# Altium footprint library TriggersLib.PcbLib: 262 footprints (part 12 of 17)
Each footprint in its own frame and in the unit in brackets; x right, y up, seen from the top. Pads: shape width x height; smd on the part's side, far side on the other; paste and mask are expansions set on the pad; w line width, h text height; cw(c..) or ccw(c..) is an arc to the next point about the centre after c.
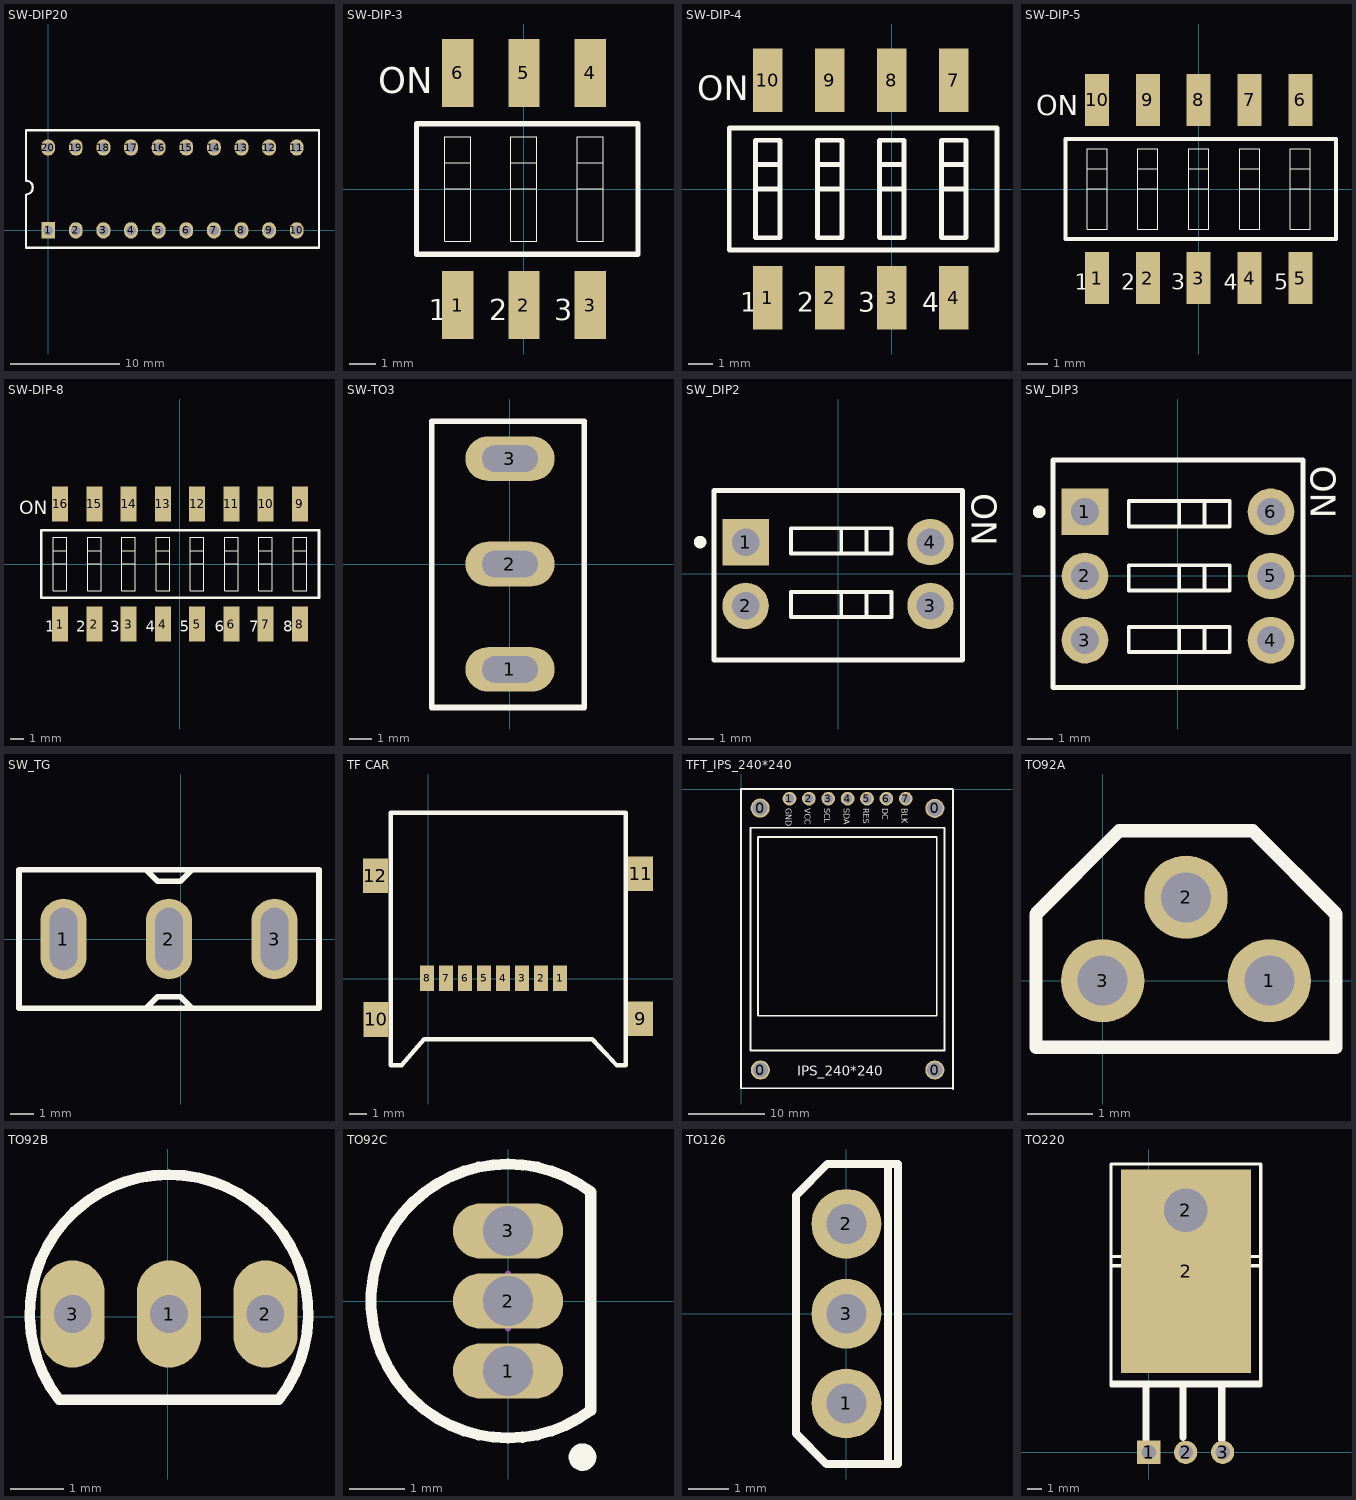
[diagram p11: the footprints below, top view; thin cyan lines are the x and y axes]

## SW-DIP20 [mm] "DIP; 16 Leads; Row Spacing 7.62 mm; Pitch 2.54 mm"
pads (20):
  rect 1.27x1.5 hole 0.9: 1(0,0)
  oval 1.27x1.5 hole 0.9: 2(2.54,0) 3(5.08,0) 4(7.62,0) 5(10.16,0) 6(12.7,0) 7(15.24,0) 8(17.78,0) 9(20.32,0) 10(22.86,0) 11(22.86,7.62) 12(20.32,7.62) 13(17.78,7.62) 14(15.24,7.62) 15(12.7,7.62) 16(10.16,7.62) 17(7.62,7.62) 18(5.08,7.62) 19(2.54,7.62) 20(0,7.62)
Top Overlay:
  lines w0.2: -2.05,-1.59 -2.05,3.3 ccw(c-2.05,3.935) -2.05,4.57 ; -2.05,4.6 -2.05,9.2 ; 24.91,-1.59 24.91,9.2
  lines w0.203: -2.05,-1.59 24.892,-1.59 ; -2.05,9.2 24.892,9.2
3D body "User Library-DIP Switch Piano 10X.STEP": height 8.71, standoff -3.99, extent -2.086,-2.639 24.794,8.661

## SW-DIP-3 [mm] "DIP Switch; 16 Leads"
height 5.06
pads (6):
  rect 1.2x2.6 smd: 1(-2.54,-4.45) 2(0,-4.45) 3(2.54,-4.45) 4(2.54,4.45) 5(0,4.45) 6(-2.54,4.45)
Top Overlay:
  lines w0.025: -3.04,0 -2.04,0 ; -3.04,1 -2.04,1 ; -0.5,0 0.5,0 ; -0.5,1 0.5,1 ; 2.04,0 3.04,0 ; 2.04,1 3.04,1 ; -3.04,-2 -3.04,2 -2.04,2 -2.04,-2 -3.04,-2 ; -0.5,-2 -0.5,2 0.5,2 0.5,-2 -0.5,-2 ; 2.04,-2 2.04,2 3.04,2 3.04,-2 2.04,-2
  lines w0.2: -4.115,-2.5 -4.115,2.5 4.369,2.5 4.369,-2.5 -4.115,-2.5
  text "3" at 1.169,-5.032 h0.8
  text "2" at -1.331,-5.032 h0.8
  text "1" at -3.656,-5.032 h0.8
  text "ON" at -5.588,3.678 h1
3D body "DIP3.stp": height 4.4, standoff 0, extent -4.293,-4.951 4.267,4.849

## SW-DIP-4 [mm] "DIP Switch; 16 Leads"
height 5.06
pads (8):
  rect 1.2x2.6 smd: 1(-5.08,-4.45) 2(-2.54,-4.45) 3(0,-4.45) 4(2.54,-4.45) 7(2.54,4.45) 8(0,4.45) 9(-2.54,4.45) 10(-5.08,4.45)
Top Overlay:
  lines w0.2: -5.58,0 -4.58,0 ; -5.58,1 -4.58,1 ; -3.04,0 -2.04,0 ; -3.04,1 -2.04,1 ; -0.5,0 0.5,0 ; -0.5,1 0.5,1 ; 2.04,0 3.04,0 ; 2.04,1 3.04,1 ; -6.655,-2.5 -6.655,2.5 4.318,2.5 4.318,-2.5 -6.655,-2.5 ; -5.58,-2 -5.58,2 -4.58,2 -4.58,-2 -5.58,-2 ; -3.04,-2 -3.04,2 -2.04,2 -2.04,-2 -3.04,-2 ; -0.5,-2 -0.5,2 0.5,2 0.5,-2 -0.5,-2 ; 2.04,-2 2.04,2 3.04,2 3.04,-2 2.04,-2
  text "4" at 1.254,-5.032 h0.8
  text "3" at -1.371,-5.032 h0.8
  text "2" at -3.871,-5.032 h0.8
  text "1" at -6.196,-5.032 h0.8
  text "ON" at -7.976,3.632 h1
3D body "User Library-SMD DIP-4 switch.step": height -0.5, standoff -5.4, extent -6.845,-4.976 4.255,4.824

## SW-DIP-5 [mm] "DIP Switch; 16 Leads"
height 5.06
pads (10):
  rect 1.2x2.6 smd: 1(-5.08,-4.45) 2(-2.54,-4.45) 3(0,-4.45) 4(2.54,-4.45) 5(5.08,-4.45) 6(5.08,4.45) 7(2.54,4.45) 8(0,4.45) 9(-2.54,4.45) 10(-5.08,4.45)
Top Overlay:
  lines w0.025: -5.58,0 -4.58,0 ; -5.58,1 -4.58,1 ; -3.04,0 -2.04,0 ; -3.04,1 -2.04,1 ; -0.5,0 0.5,0 ; -0.5,1 0.5,1 ; 2.04,0 3.04,0 ; 2.04,1 3.04,1 ; 4.58,0 5.58,0 ; 4.58,1 5.58,1 ; -5.58,-2 -5.58,2 -4.58,2 -4.58,-2 -5.58,-2 ; -3.04,-2 -3.04,2 -2.04,2 -2.04,-2 -3.04,-2 ; -0.5,-2 -0.5,2 0.5,2 0.5,-2 -0.5,-2 ; 2.04,-2 2.04,2 3.04,2 3.04,-2 2.04,-2 ; 4.58,-2 4.58,2 5.58,2 5.58,-2 4.58,-2
  lines w0.2: -6.655,-2.5 -6.655,2.5 6.858,2.5 6.858,-2.5 -6.655,-2.5
  text "5" at 3.779,-5.032 h0.8
  text "4" at 1.254,-5.032 h0.8
  text "3" at -1.371,-5.032 h0.8
  text "2" at -3.871,-5.032 h0.8
  text "1" at -6.196,-5.032 h0.8
  text "ON" at -8.128,3.678 h1
3D body "DIP5.stp": height 4.4, standoff 0, extent -6.795,-5.105 6.845,4.695

## SW-DIP-8 [mm] "DIP Switch; 16 Leads"
height 5.06
pads (16):
  rect 1.2x2.6 smd: 1(-8.89,-4.45) 2(-6.35,-4.45) 3(-3.81,-4.45) 4(-1.27,-4.45) 5(1.27,-4.45) 6(3.81,-4.45) 7(6.35,-4.45) 8(8.89,-4.45) 9(8.89,4.45) 10(6.35,4.45) 11(3.81,4.45) 12(1.27,4.45) 13(-1.27,4.45) 14(-3.81,4.45) 15(-6.35,4.45) 16(-8.89,4.45)
Top Overlay:
  lines w0.025: -9.39,0 -8.39,0 ; -9.39,1 -8.39,1 ; -6.85,0 -5.85,0 ; -6.85,1 -5.85,1 ; -4.31,0 -3.31,0 ; -4.31,1 -3.31,1 ; -1.77,0 -0.77,0 ; -1.77,1 -0.77,1 ; 0.77,0 1.77,0 ; 0.77,1 1.77,1 ; 3.31,0 4.31,0 ; 3.31,1 4.31,1 ; 5.85,0 6.85,0 ; 5.85,1 6.85,1 ; 8.39,0 9.39,0 ; 8.39,1 9.39,1 ; -9.39,-2 -8.39,-2 -8.39,2 -9.39,2 -9.39,-2 ; -6.85,-2 -5.85,-2 -5.85,2 -6.85,2 -6.85,-2 ; -4.31,-2 -3.31,-2 -3.31,2 -4.31,2 -4.31,-2 ; -1.77,-2 -0.77,-2 -0.77,2 -1.77,2 -1.77,-2 ; 0.77,-2 1.77,-2 1.77,2 0.77,2 0.77,-2 ; 3.31,-2 4.31,-2 4.31,2 3.31,2 3.31,-2 ; 5.85,-2 6.85,-2 6.85,2 5.85,2 5.85,-2 ; 8.39,-2 9.39,-2 9.39,2 8.39,2 8.39,-2
  lines w0.2: -10.29,-2.5 10.31,-2.5 10.31,2.5 -10.29,2.5 -10.29,-2.5
  text "8" at 7.659,-5.032 h0.8
  text "7" at 5.119,-5.032 h0.8
  text "ON" at -11.938,3.678 h1
  text "1" at -10.006,-5.032 h0.8
  text "2" at -7.681,-5.032 h0.8
  text "3" at -5.181,-5.032 h0.8
  text "4" at -2.556,-5.032 h0.8
  text "5" at -0.031,-5.032 h0.8
  text "6" at 2.569,-5.032 h0.8
3D body "SW3dPS-219-8MST.STEP": height 4.3, standoff 0.05, extent -10.182,-4.83 10.182,5.08

## SW-TO3 [mm]
height 2.38
pads (3):
  oval 4x2 hole 1.2 slot 2.5 at 0 deg: 1(0,-4.724) 2(0,0) 3(0,4.724)
Top Overlay:
  lines w0.254: -3.504,-6.433 -3.504,6.394 3.329,6.394 3.329,-6.433 -3.504,-6.433
3D body "7101SYZBE CK switch.step": height 28.55, standoff -3.83, extent -3.43,-6.363 3.43,6.35

## SW_DIP2 [mm] "DIP Switch; 16 Leads"
height 5.06
pads (4):
  rect 1.85x1.85 hole 1.1: 1(-3.683,1.27)
  round 1.85 hole 1.1: 2(-3.683,-1.27) 3(3.683,-1.27) 4(3.683,1.27)
Top Overlay:
  circle w0.25: c-5.496,1.271 r0.125
  lines w0.152: 0.127,-1.719 0.127,-0.719 ; 0.127,0.821 0.127,1.821 ; 1.127,-1.719 1.127,-0.719 ; 1.127,0.821 1.127,1.821 ; -1.873,-1.719 2.127,-1.719 2.127,-0.719 -1.873,-0.719 -1.873,-1.719 ; -1.873,0.821 2.127,0.821 2.127,1.821 -1.873,1.821 -1.873,0.821
  lines w0.2: -4.94,-3.429 -4.94,3.327 4.953,3.327 4.953,-3.429 -4.94,-3.429
  text "ON" at 5.334,3.226 h1
3D body "19619.stp": height 10.3, standoff 0, extent -5.001,-3.396 4.899,3.244

## SW_DIP3 [mm] "Switch; 6 Leads"
pads (6):
  rect 1.85x1.85 hole 1.1: 1(-3.683,2.54)
  round 1.85 hole 1.1: 2(-3.683,0) 3(-3.683,-2.54) 4(3.683,-2.54) 5(3.683,0) 6(3.683,2.54)
Top Overlay:
  circle w0.25: c-5.496,2.541 r0.125
  lines w0.152: 0.051,-3.015 0.051,-2.015 ; 0.051,-0.576 0.051,0.424 ; 0.051,1.964 0.051,2.964 ; 1.051,-3.015 1.051,-2.015 ; 1.051,-0.576 1.051,0.424 ; 1.051,1.964 1.051,2.964 ; -1.949,-3.015 -1.949,-2.015 2.051,-2.015 2.051,-3.015 -1.949,-3.015 ; -1.949,-0.576 2.051,-0.576 2.051,0.424 -1.949,0.424 -1.949,-0.576 ; -1.949,1.964 2.051,1.964 2.051,2.964 -1.949,2.964 -1.949,1.964
  lines w0.2: -4.94,-4.42 4.953,-4.42 4.953,4.597 -4.94,4.597 -4.94,-4.42
  text "ON" at 5.258,4.369 h1
3D body "19620.stp": height 6.15, standoff -3.05, extent -4.975,-4.539 4.925,4.641

## SW_TG [mm]
pads (3):
  oval 2x3.5 hole 1.2 slot 2.7 at 90 deg: 1(-5.072,0) 2(-0.5,0) 3(4.072,0)
Top Overlay:
  lines w0.254: -1.5,-3 -1,-2.5 0,-2.5 0.5,-3 ; -1.5,3 -1,2.5 0,2.5 0.5,3 ; -7,-3 6,-3 6,3 -7,3 -7,-3

## TF CAR [mm]
pads (12):
  rect 0.8x1.5 smd: 1(7.624,0.025) 2(6.524,0.025) 3(5.424,0.025) 4(4.324,0.025) 5(3.224,0.025) 6(2.124,0.025) 7(1.024,0.025) 8(-0.076,0.025)
  rect 1.45x2 smd: 9(12.294,-2.311) 10(-3.023,-2.362) 11(12.294,6.071) 12(-3.073,5.969)
Top Overlay:
  lines w0.254: -2.174,-5.002 -2.174,9.598 11.426,9.598 11.426,-5.002 10.895,-5.002 9.496,-3.502 -0.244,-3.502 -1.551,-5.002 -2.174,-5.002
3D body "MICROSD.step": height 1.93, standoff -0.02, extent -2.713,-4.837 11.887,9.663

## TFT_IPS_240*240 [mm]
pads (11):
  round 2.5 hole 2: 0(2.5,-2.5) 0(2.54,-36.83) 0(25.4,-36.83) 0(25.4,-2.54)
  round 1.8 hole 1.2: 1(6.35,-1.27) 2(8.89,-1.27) 3(11.43,-1.27) 4(13.97,-1.27) 5(16.51,-1.27) 6(19.05,-1.27) 7(21.59,-1.27)
Top Overlay:
  lines w0.254: 27.7,-39.218 0,-39.218 0,0 27.7,0 ; 27.78,-39.319 27.78,-0.102 ; 1.27,-34.29 1.27,-5.08 26.67,-5.08 26.67,-34.29 1.27,-34.29 ; 2.254,-29.718 25.654,-29.718 25.654,-6.318 2.254,-6.318 2.254,-29.718
  text "IPS_240*240" at 7.366,-37.592 h1.27
  text "BLK" at 21.082,-2.54 h0.76
  text "DC" at 18.542,-2.54 h0.76
  text "RES" at 16.002,-2.54 h0.76
  text "SDA" at 13.462,-2.54 h0.76
  text "SCL" at 10.922,-2.54 h0.76
  text "VCC" at 8.382,-2.54 h0.76
  text "GND" at 5.842,-2.54 h0.76

## TO92A [mil] "7805/7809/LP2950电源芯片（未加焊）"
pads (3):
  round 50 hole 30: 1(100,0) 2(50,50) 3(0,0)
Top Overlay:
  lines w8: -40,-40 -40,40 10,90 90,90 140,40 140,-40 -40,-40
3D body "micromsd_n.stp": height 269.29, standoff -118.11, extent -39.17,-37.8 138.78,96.06

## TO92B [mm] "TO, Flat Index; 3 In-Line, Axial Leads; Body Dia. 4.8mm; Leads 0.48 x 0.5 mm (max)"
height 5.33
pads (3):
  oval 1.2x2 hole 0.7: 1(0.025,0.051) 2(1.825,0.051) 3(-1.775,0.051)
Top Overlay:
  lines w0.2: -2.023,-1.55 cw(c0.025,0.051) 2.074,-1.55 ; -1.965,-1.549 2.015,-1.549
3D body "TO-92S.STEP": height 6.1, standoff -4.5, extent -2.271,-1.21 2.321,2.347

## TO92C [mm] "TO, Flat Index; 3 In-Line, Axial Leads; Body Dia. 4.5mm; Leads 0.51 x 0.48 mm (max)"
height 6.86
pads (3):
  oval 2x1 hole 0.9: 1(0,-1.27) 2(0,0) 3(0,1.27)
Top Overlay:
  circle w0.25: c1.35,-2.83 r0.125
  lines w0.2: 1.5,-1.981 1.5,1.956 ; 1.5,-1.98 cw(c0,0) 1.5,1.98
Mechanical 13:
  lines w0.1: 1.5,-1.98 1.5,1.98
Mechanical 15:
  lines w0.1: -0.5,0 0.5,0 ; 0,-0.5 0,0.5
3D body "TO-92-2.STEP": height 8.09, standoff -6.11, extent -2.318,-2.45 1.682,2.349

## TO126 [mm] "BD135"
pads (3):
  round 1.75 hole 1: 1(0,-2.25) 2(0,2.25) 3(0,0)
Top Overlay:
  lines w0.2: 1.041,-3.734 1.041,3.734 ; -1.268,-3.005 -1.268,2.964 -0.48,3.752 1.295,3.752 1.295,-3.767 -0.506,-3.767 -1.268,-3.005
3D body "BD135 (TO-126 SOT32) v4.step": height 14.6, standoff -3.35, extent -1.797,-3.934 0.903,3.866

## TO220 [mm]
pads (5):
  rect 1.6x1.6 hole 1: 1(0,0)
  round 1.6 hole 1: 2(2.54,0) 3(5.08,0)
  round 4 hole 3: 2(2.54,16.637)
  rect 8.9x14 smd: 2(2.565,12.446)
Top Overlay:
  lines w0.22: -2.591,4.699 7.696,4.699 ; -2.591,4.826 7.696,4.826 ; -2.591,12.827 7.696,12.827 ; -2.591,13.462 7.696,13.462 ; -2.591,19.05 -2.591,19.812 7.696,19.812 7.696,4.572 -2.591,4.572 -2.591,19.558
  lines w0.5: -0.178,0.889 -0.178,4.572 ; 2.362,1.016 2.362,4.699 ; 5.029,0.889 5.029,4.572
3D body "User Library-TO220 L.STEP": height 4.5, standoff -3, extent -2.638,-0.127 7.362,19.577